# Altium integrated library Samtec_2_mm_Pitch_Socket_Strips.IntLib: 251 symbols (part 2 of 3) (continued)
## SMM-105-01-L-D (continued)
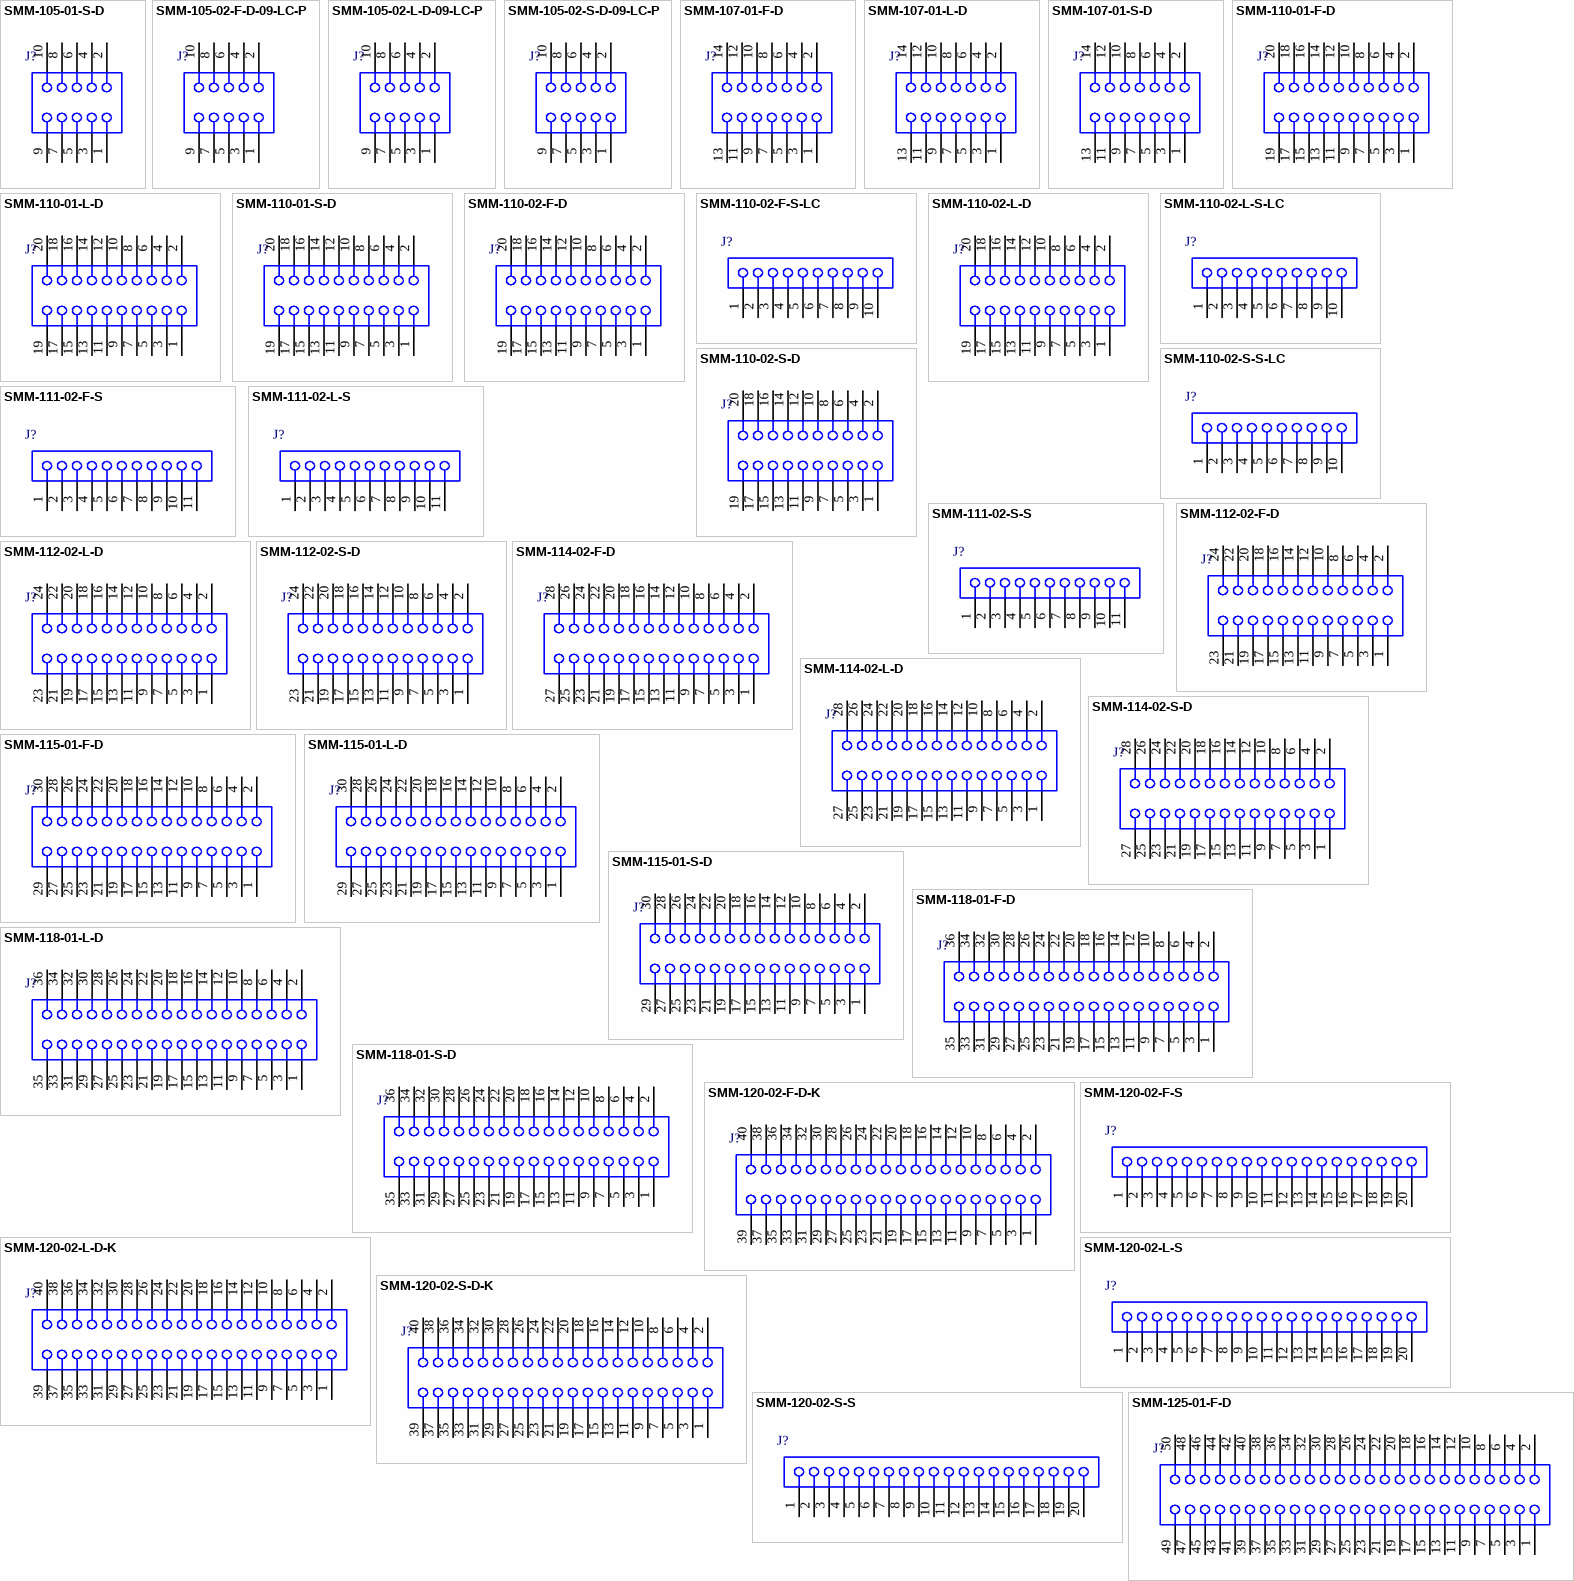
[diagram p4: symbols SMM-105-01-S-D to SMM-125-01-F-D]

## SMM-105-01-S-D
designator J?
Tiger Eye(TM) Socket Strip, Through-hole, Vertical, -55 to 125 degC, 2 mm Pitch, 10-Pin, Female, RoHS; Manufacturer: Samtec; PartNumber: SMM-105-01-S-D; Pitch: 2 mm; DatasheetVersion: F-214; PackageVersion: AU, 5/1991; PackageReference: SMM-105-01-X-D; PackageDescription: 2 mm Socket Strip; Supplier 1: Newark; Supplier Part Number 1: 97P8380; Orientation: Vertical; RoHS: True; Temperature Range: -55 to 125 degC; Mounting Technology: Through-hole; ComponentLink1Description: Manufacturer URL; ComponentLink1URL: http://www.samtec.com; ComponentLink2Description: Datasheet; ComponentLink2URL: http://www.samtec.com/documents/webfiles/pdf/SMM.PDF; ComponentLink3Description: Package Specification; ComponentLink3URL: http://www.samtec.com/documents/webfiles/cpdf/SMM-1XX-XX-XX-D-XX-XX-X-XX-MKT1.pdf
footprint SMTC-SMM-105-01-X-D (Socket Strip, 2x5 Pins, Vertical, 2mm Pitch, Female)
pins: 1, 2, 3, 4, 5, 6, 7, 8, 9, 10

## SMM-105-02-F-D-09-LC-P
designator J?
Tiger Eye(TM) Socket Strip, Surface Mount, Vertical, -55 to 125 degC, 2 mm Pitch, 10-Pin, Female, RoHS; Manufacturer: Samtec; PartNumber: SMM-105-02-F-D-09-LC-P; Pitch: 2 mm; DatasheetVersion: F-214; PackageVersion: AU, 5/1991; PackageReference: SMM-105-02-X-D-09-LC-P; PackageDescription: 2 mm Socket Strip; Orientation: Vertical; RoHS: True; Temperature Range: -55 to 125 degC; Mounting Technology: Surface Mount; ComponentLink1Description: Manufacturer URL; ComponentLink1URL: http://www.samtec.com; ComponentLink2Description: Datasheet; ComponentLink2URL: http://www.samtec.com/documents/webfiles/pdf/SMM.PDF; ComponentLink3Description: Package Specification; ComponentLink3URL: http://www.samtec.com/documents/webfiles/cpdf/SMM-1XX-XX-XX-D-XX-XX-X-XX-MKT1.pdf
footprint SMTC-SMM-105-02-X-D-09-LC-P (Socket Strip, 2x5 Pins, Vertical, 2mm Pitch, Female)
pins: 1, 2, 3, 4, 5, 6, 7, 8, 9, 10

## SMM-105-02-L-D-09-LC-P
designator J?
Tiger Eye(TM) Socket Strip, Surface Mount, Vertical, -55 to 125 degC, 2 mm Pitch, 10-Pin, Female, RoHS; Manufacturer: Samtec; PartNumber: SMM-105-02-L-D-09-LC-P; Pitch: 2 mm; DatasheetVersion: F-214; PackageVersion: AU, 5/1991; PackageReference: SMM-105-02-X-D-09-LC-P; PackageDescription: 2 mm Socket Strip; Orientation: Vertical; RoHS: True; Temperature Range: -55 to 125 degC; Mounting Technology: Surface Mount; ComponentLink1Description: Manufacturer URL; ComponentLink1URL: http://www.samtec.com; ComponentLink2Description: Datasheet; ComponentLink2URL: http://www.samtec.com/documents/webfiles/pdf/SMM.PDF; ComponentLink3Description: Package Specification; ComponentLink3URL: http://www.samtec.com/documents/webfiles/cpdf/SMM-1XX-XX-XX-D-XX-XX-X-XX-MKT1.pdf
footprint SMTC-SMM-105-02-X-D-09-LC-P (Socket Strip, 2x5 Pins, Vertical, 2mm Pitch, Female)
pins: 1, 2, 3, 4, 5, 6, 7, 8, 9, 10

## SMM-105-02-S-D-09-LC-P
designator J?
Tiger Eye(TM) Socket Strip, Surface Mount, Vertical, -55 to 125 degC, 2 mm Pitch, 10-Pin, Female, RoHS; Manufacturer: Samtec; PartNumber: SMM-105-02-S-D-09-LC-P; Pitch: 2 mm; DatasheetVersion: F-214; PackageVersion: AU, 5/1991; PackageReference: SMM-105-02-X-D-09-LC-P; PackageDescription: 2 mm Socket Strip; Orientation: Vertical; RoHS: True; Temperature Range: -55 to 125 degC; Mounting Technology: Surface Mount; ComponentLink1Description: Manufacturer URL; ComponentLink1URL: http://www.samtec.com; ComponentLink2Description: Datasheet; ComponentLink2URL: http://www.samtec.com/documents/webfiles/pdf/SMM.PDF; ComponentLink3Description: Package Specification; ComponentLink3URL: http://www.samtec.com/documents/webfiles/cpdf/SMM-1XX-XX-XX-D-XX-XX-X-XX-MKT1.pdf
footprint SMTC-SMM-105-02-X-D-09-LC-P (Socket Strip, 2x5 Pins, Vertical, 2mm Pitch, Female)
pins: 1, 2, 3, 4, 5, 6, 7, 8, 9, 10

## SMM-107-01-F-D
designator J?
Tiger Eye(TM) Socket Strip, Through-hole, Vertical, -55 to 125 degC, 2 mm Pitch, 14-Pin, Female, RoHS; Manufacturer: Samtec; PartNumber: SMM-107-01-F-D; Pitch: 2 mm; DatasheetVersion: F-214; PackageVersion: AU, 5/1991; PackageReference: SMM-107-01-X-D; PackageDescription: 2 mm Socket Strip; Orientation: Vertical; RoHS: True; Temperature Range: -55 to 125 degC; Mounting Technology: Through-hole; ComponentLink1Description: Manufacturer URL; ComponentLink1URL: http://www.samtec.com; ComponentLink2Description: Datasheet; ComponentLink2URL: http://www.samtec.com/documents/webfiles/pdf/SMM.PDF; ComponentLink3Description: Package Specification; ComponentLink3URL: http://www.samtec.com/documents/webfiles/cpdf/SMM-1XX-XX-XX-D-XX-XX-X-XX-MKT1.pdf
footprint SMTC-SMM-107-01-X-D (Socket Strip, 2x7 Pins, Vertical, 2mm Pitch, Female)
pins: 1, 2, 3, 4, 5, 6, 7, 8, 9, 10, 11, 12, 13, 14

## SMM-107-01-L-D
designator J?
Tiger Eye(TM) Socket Strip, Through-hole, Vertical, -55 to 125 degC, 2 mm Pitch, 14-Pin, Female, RoHS; Manufacturer: Samtec; PartNumber: SMM-107-01-L-D; Pitch: 2 mm; DatasheetVersion: F-214; PackageVersion: AU, 5/1991; PackageReference: SMM-107-01-X-D; PackageDescription: 2 mm Socket Strip; Orientation: Vertical; RoHS: True; Temperature Range: -55 to 125 degC; Mounting Technology: Through-hole; ComponentLink1Description: Manufacturer URL; ComponentLink1URL: http://www.samtec.com; ComponentLink2Description: Datasheet; ComponentLink2URL: http://www.samtec.com/documents/webfiles/pdf/SMM.PDF; ComponentLink3Description: Package Specification; ComponentLink3URL: http://www.samtec.com/documents/webfiles/cpdf/SMM-1XX-XX-XX-D-XX-XX-X-XX-MKT1.pdf
footprint SMTC-SMM-107-01-X-D (Socket Strip, 2x7 Pins, Vertical, 2mm Pitch, Female)
pins: 1, 2, 3, 4, 5, 6, 7, 8, 9, 10, 11, 12, 13, 14

## SMM-107-01-S-D
designator J?
Tiger Eye(TM) Socket Strip, Through-hole, Vertical, -55 to 125 degC, 2 mm Pitch, 14-Pin, Female, RoHS; Manufacturer: Samtec; PartNumber: SMM-107-01-S-D; Pitch: 2 mm; DatasheetVersion: F-214; PackageVersion: AU, 5/1991; PackageReference: SMM-107-01-X-D; PackageDescription: 2 mm Socket Strip; Orientation: Vertical; RoHS: True; Temperature Range: -55 to 125 degC; Mounting Technology: Through-hole; ComponentLink1Description: Manufacturer URL; ComponentLink1URL: http://www.samtec.com; ComponentLink2Description: Datasheet; ComponentLink2URL: http://www.samtec.com/documents/webfiles/pdf/SMM.PDF; ComponentLink3Description: Package Specification; ComponentLink3URL: http://www.samtec.com/documents/webfiles/cpdf/SMM-1XX-XX-XX-D-XX-XX-X-XX-MKT1.pdf
footprint SMTC-SMM-107-01-X-D (Socket Strip, 2x7 Pins, Vertical, 2mm Pitch, Female)
pins: 1, 2, 3, 4, 5, 6, 7, 8, 9, 10, 11, 12, 13, 14

## SMM-110-01-F-D
designator J?
Tiger Eye(TM) Socket Strip, Through-hole, Vertical, -55 to 125 degC, 2 mm Pitch, 20-Pin, Female, RoHS; Manufacturer: Samtec; PartNumber: SMM-110-01-F-D; Pitch: 2 mm; DatasheetVersion: F-214; PackageVersion: AU, 5/1991; PackageReference: SMM-110-01-X-D; PackageDescription: 2 mm Socket Strip; Orientation: Vertical; RoHS: True; Temperature Range: -55 to 125 degC; Mounting Technology: Through-hole; ComponentLink1Description: Manufacturer URL; ComponentLink1URL: http://www.samtec.com; ComponentLink2Description: Datasheet; ComponentLink2URL: http://www.samtec.com/documents/webfiles/pdf/SMM.PDF; ComponentLink3Description: Package Specification; ComponentLink3URL: http://www.samtec.com/documents/webfiles/cpdf/SMM-1XX-XX-XX-D-XX-XX-X-XX-MKT1.pdf
footprint SMTC-SMM-110-01-X-D (Socket Strip, 2x10 Pins, Vertical, 2mm Pitch, Female)
pins: 1, 2, 3, 4, 5, 6, 7, 8, 9, 10, 11, 12, 13, 14, 15, 16, 17, 18, 19, 20

## SMM-110-01-L-D
designator J?
Tiger Eye(TM) Socket Strip, Through-hole, Vertical, -55 to 125 degC, 2 mm Pitch, 20-Pin, Female, RoHS; Manufacturer: Samtec; PartNumber: SMM-110-01-L-D; Pitch: 2 mm; DatasheetVersion: F-214; PackageVersion: AU, 5/1991; PackageReference: SMM-110-01-X-D; PackageDescription: 2 mm Socket Strip; Orientation: Vertical; RoHS: True; Temperature Range: -55 to 125 degC; Mounting Technology: Through-hole; ComponentLink1Description: Manufacturer URL; ComponentLink1URL: http://www.samtec.com; ComponentLink2Description: Datasheet; ComponentLink2URL: http://www.samtec.com/documents/webfiles/pdf/SMM.PDF; ComponentLink3Description: Package Specification; ComponentLink3URL: http://www.samtec.com/documents/webfiles/cpdf/SMM-1XX-XX-XX-D-XX-XX-X-XX-MKT1.pdf
footprint SMTC-SMM-110-01-X-D (Socket Strip, 2x10 Pins, Vertical, 2mm Pitch, Female)
pins: 1, 2, 3, 4, 5, 6, 7, 8, 9, 10, 11, 12, 13, 14, 15, 16, 17, 18, 19, 20

## SMM-110-01-S-D
designator J?
Tiger Eye(TM) Socket Strip, Through-hole, Vertical, -55 to 125 degC, 2 mm Pitch, 20-Pin, Female, RoHS; Manufacturer: Samtec; PartNumber: SMM-110-01-S-D; Pitch: 2 mm; DatasheetVersion: F-214; PackageVersion: AU, 5/1991; PackageReference: SMM-110-01-X-D; PackageDescription: 2 mm Socket Strip; Orientation: Vertical; RoHS: True; Temperature Range: -55 to 125 degC; Mounting Technology: Through-hole; ComponentLink1Description: Manufacturer URL; ComponentLink1URL: http://www.samtec.com; ComponentLink2Description: Datasheet; ComponentLink2URL: http://www.samtec.com/documents/webfiles/pdf/SMM.PDF; ComponentLink3Description: Package Specification; ComponentLink3URL: http://www.samtec.com/documents/webfiles/cpdf/SMM-1XX-XX-XX-D-XX-XX-X-XX-MKT1.pdf
footprint SMTC-SMM-110-01-X-D (Socket Strip, 2x10 Pins, Vertical, 2mm Pitch, Female)
pins: 1, 2, 3, 4, 5, 6, 7, 8, 9, 10, 11, 12, 13, 14, 15, 16, 17, 18, 19, 20

## SMM-110-02-F-D
designator J?
Tiger Eye(TM) Socket Strip, Surface Mount, Vertical, -55 to 125 degC, 2 mm Pitch, 20-Pin, Female, RoHS; Manufacturer: Samtec; PartNumber: SMM-110-02-F-D; Pitch: 2 mm; DatasheetVersion: F-214; PackageVersion: AU, 5/1991; PackageReference: SMM-110-02-X-D; PackageDescription: 2 mm Socket Strip; Orientation: Vertical; RoHS: True; Temperature Range: -55 to 125 degC; Mounting Technology: Surface Mount; ComponentLink1Description: Manufacturer URL; ComponentLink1URL: http://www.samtec.com; ComponentLink2Description: Datasheet; ComponentLink2URL: http://www.samtec.com/documents/webfiles/pdf/SMM.PDF; ComponentLink3Description: Package Specification; ComponentLink3URL: http://www.samtec.com/documents/webfiles/cpdf/SMM-1XX-XX-XX-D-XX-XX-X-XX-MKT1.pdf
footprint SMTC-SMM-110-02-X-D (Socket Strip, 2x10 Pins, Vertical, 2mm Pitch, Female)
pins: 1, 2, 3, 4, 5, 6, 7, 8, 9, 10, 11, 12, 13, 14, 15, 16, 17, 18, 19, 20

## SMM-110-02-F-S-LC
designator J?
Tiger Eye(TM) Socket Strip, Surface Mount, Vertical, -55 to 125 degC, 2 mm Pitch, 10-Pin, Female, RoHS; Manufacturer: Samtec; PartNumber: SMM-110-02-F-S-LC; Pitch: 2 mm; DatasheetVersion: F-214; PackageVersion: BC, 5/1991; PackageReference: SMM-110-02-X-S-LC; PackageDescription: 2 mm Socket Strip (Single Row); Orientation: Vertical; RoHS: True; Temperature Range: -55 to 125 degC; Mounting Technology: Surface Mount; ComponentLink1Description: Manufacturer URL; ComponentLink1URL: http://www.samtec.com; ComponentLink2Description: Datasheet; ComponentLink2URL: http://www.samtec.com/documents/webfiles/pdf/SMM.PDF; ComponentLink3Description: Package Specification; ComponentLink3URL: http://www.samtec.com/documents/webfiles/cpdf/SMM-1XX-XX-XX-S-XX-X-XX-XX-MKT.pdf
footprint SMTC-SMM-110-02-X-S-LC (Socket Strip, 10 Pins, Vertical, 2mm Pitch, Female)
pins: 1, 2, 3, 4, 5, 6, 7, 8, 9, 10

## SMM-110-02-L-D
designator J?
Tiger Eye(TM) Socket Strip, Surface Mount, Vertical, -55 to 125 degC, 2 mm Pitch, 20-Pin, Female, RoHS; Manufacturer: Samtec; PartNumber: SMM-110-02-L-D; Pitch: 2 mm; DatasheetVersion: F-214; PackageVersion: AU, 5/1991; PackageReference: SMM-110-02-X-D; PackageDescription: 2 mm Socket Strip; Orientation: Vertical; RoHS: True; Temperature Range: -55 to 125 degC; Mounting Technology: Surface Mount; ComponentLink1Description: Manufacturer URL; ComponentLink1URL: http://www.samtec.com; ComponentLink2Description: Datasheet; ComponentLink2URL: http://www.samtec.com/documents/webfiles/pdf/SMM.PDF; ComponentLink3Description: Package Specification; ComponentLink3URL: http://www.samtec.com/documents/webfiles/cpdf/SMM-1XX-XX-XX-D-XX-XX-X-XX-MKT1.pdf
footprint SMTC-SMM-110-02-X-D (Socket Strip, 2x10 Pins, Vertical, 2mm Pitch, Female)
pins: 1, 2, 3, 4, 5, 6, 7, 8, 9, 10, 11, 12, 13, 14, 15, 16, 17, 18, 19, 20

## SMM-110-02-L-S-LC
designator J?
Tiger Eye(TM) Socket Strip, Surface Mount, Vertical, -55 to 125 degC, 2 mm Pitch, 10-Pin, Female, RoHS; Manufacturer: Samtec; PartNumber: SMM-110-02-L-S-LC; Pitch: 2 mm; DatasheetVersion: F-214; PackageVersion: BC, 5/1991; PackageReference: SMM-110-02-X-S-LC; PackageDescription: 2 mm Socket Strip (Single Row); Orientation: Vertical; RoHS: True; Temperature Range: -55 to 125 degC; Mounting Technology: Surface Mount; ComponentLink1Description: Manufacturer URL; ComponentLink1URL: http://www.samtec.com; ComponentLink2Description: Datasheet; ComponentLink2URL: http://www.samtec.com/documents/webfiles/pdf/SMM.PDF; ComponentLink3Description: Package Specification; ComponentLink3URL: http://www.samtec.com/documents/webfiles/cpdf/SMM-1XX-XX-XX-S-XX-X-XX-XX-MKT.pdf
footprint SMTC-SMM-110-02-X-S-LC (Socket Strip, 10 Pins, Vertical, 2mm Pitch, Female)
pins: 1, 2, 3, 4, 5, 6, 7, 8, 9, 10

## SMM-110-02-S-D
designator J?
Tiger Eye(TM) Socket Strip, Surface Mount, Vertical, -55 to 125 degC, 2 mm Pitch, 20-Pin, Female, RoHS; Manufacturer: Samtec; PartNumber: SMM-110-02-S-D; Pitch: 2 mm; DatasheetVersion: F-214; PackageVersion: AU, 5/1991; PackageReference: SMM-110-02-X-D; PackageDescription: 2 mm Socket Strip; Supplier 1: Digi-Key; Supplier Part Number 1: SAM1243-10-ND; Supplier 2: Farnell; Supplier Part Number 2: 1668126; Orientation: Vertical; RoHS: True; Temperature Range: -55 to 125 degC; Mounting Technology: Surface Mount; ComponentLink1Description: Manufacturer URL; ComponentLink1URL: http://www.samtec.com; ComponentLink2Description: Datasheet; ComponentLink2URL: http://www.samtec.com/documents/webfiles/pdf/SMM.PDF; ComponentLink3Description: Package Specification; ComponentLink3URL: http://www.samtec.com/documents/webfiles/cpdf/SMM-1XX-XX-XX-D-XX-XX-X-XX-MKT1.pdf
footprint SMTC-SMM-110-02-X-D (Socket Strip, 2x10 Pins, Vertical, 2mm Pitch, Female)
pins: 1, 2, 3, 4, 5, 6, 7, 8, 9, 10, 11, 12, 13, 14, 15, 16, 17, 18, 19, 20

## SMM-110-02-S-S-LC
designator J?
Tiger Eye(TM) Socket Strip, Surface Mount, Vertical, -55 to 125 degC, 2 mm Pitch, 10-Pin, Female, RoHS; Manufacturer: Samtec; PartNumber: SMM-110-02-S-S-LC; Pitch: 2 mm; DatasheetVersion: F-214; PackageVersion: BC, 5/1991; PackageReference: SMM-110-02-X-S-LC; PackageDescription: 2 mm Socket Strip (Single Row); Orientation: Vertical; RoHS: True; Temperature Range: -55 to 125 degC; Mounting Technology: Surface Mount; ComponentLink1Description: Manufacturer URL; ComponentLink1URL: http://www.samtec.com; ComponentLink2Description: Datasheet; ComponentLink2URL: http://www.samtec.com/documents/webfiles/pdf/SMM.PDF; ComponentLink3Description: Package Specification; ComponentLink3URL: http://www.samtec.com/documents/webfiles/cpdf/SMM-1XX-XX-XX-S-XX-X-XX-XX-MKT.pdf
footprint SMTC-SMM-110-02-X-S-LC (Socket Strip, 10 Pins, Vertical, 2mm Pitch, Female)
pins: 1, 2, 3, 4, 5, 6, 7, 8, 9, 10

## SMM-111-02-F-S
designator J?
Tiger Eye(TM) Socket Strip, Surface Mount, Vertical, -55 to 125 degC, 2 mm Pitch, 11-Pin, Female, RoHS; Manufacturer: Samtec; PartNumber: SMM-111-02-F-S; Pitch: 2 mm; DatasheetVersion: F-214; PackageVersion: BC, 5/1991; PackageReference: SMM-111-02-X-S; PackageDescription: 2 mm Socket Strip (Single Row); Orientation: Vertical; RoHS: True; Temperature Range: -55 to 125 degC; Mounting Technology: Surface Mount; ComponentLink1Description: Manufacturer URL; ComponentLink1URL: http://www.samtec.com; ComponentLink2Description: Datasheet; ComponentLink2URL: http://www.samtec.com/documents/webfiles/pdf/SMM.PDF; ComponentLink3Description: Package Specification; ComponentLink3URL: http://www.samtec.com/documents/webfiles/cpdf/SMM-1XX-XX-XX-S-XX-X-XX-XX-MKT.pdf
footprint SMTC-SMM-111-02-X-S (Socket Strip, 11 Pins, Vertical, 2mm Pitch, Female)
pins: 1, 2, 3, 4, 5, 6, 7, 8, 9, 10, 11

## SMM-111-02-L-S
designator J?
Tiger Eye(TM) Socket Strip, Surface Mount, Vertical, -55 to 125 degC, 2 mm Pitch, 11-Pin, Female, RoHS; Manufacturer: Samtec; PartNumber: SMM-111-02-L-S; Pitch: 2 mm; DatasheetVersion: F-214; PackageVersion: BC, 5/1991; PackageReference: SMM-111-02-X-S; PackageDescription: 2 mm Socket Strip (Single Row); Orientation: Vertical; RoHS: True; Temperature Range: -55 to 125 degC; Mounting Technology: Surface Mount; ComponentLink1Description: Manufacturer URL; ComponentLink1URL: http://www.samtec.com; ComponentLink2Description: Datasheet; ComponentLink2URL: http://www.samtec.com/documents/webfiles/pdf/SMM.PDF; ComponentLink3Description: Package Specification; ComponentLink3URL: http://www.samtec.com/documents/webfiles/cpdf/SMM-1XX-XX-XX-S-XX-X-XX-XX-MKT.pdf
footprint SMTC-SMM-111-02-X-S (Socket Strip, 11 Pins, Vertical, 2mm Pitch, Female)
pins: 1, 2, 3, 4, 5, 6, 7, 8, 9, 10, 11

## SMM-111-02-S-S
designator J?
Tiger Eye(TM) Socket Strip, Surface Mount, Vertical, -55 to 125 degC, 2 mm Pitch, 11-Pin, Female, RoHS; Manufacturer: Samtec; PartNumber: SMM-111-02-S-S; Pitch: 2 mm; DatasheetVersion: F-214; PackageVersion: BC, 5/1991; PackageReference: SMM-111-02-X-S; PackageDescription: 2 mm Socket Strip (Single Row); Supplier 1: Digi-Key; Supplier Part Number 1: SAM1244-11-ND; Orientation: Vertical; RoHS: True; Temperature Range: -55 to 125 degC; Mounting Technology: Surface Mount; ComponentLink1Description: Manufacturer URL; ComponentLink1URL: http://www.samtec.com; ComponentLink2Description: Datasheet; ComponentLink2URL: http://www.samtec.com/documents/webfiles/pdf/SMM.PDF; ComponentLink3Description: Package Specification; ComponentLink3URL: http://www.samtec.com/documents/webfiles/cpdf/SMM-1XX-XX-XX-S-XX-X-XX-XX-MKT.pdf
footprint SMTC-SMM-111-02-X-S (Socket Strip, 11 Pins, Vertical, 2mm Pitch, Female)
pins: 1, 2, 3, 4, 5, 6, 7, 8, 9, 10, 11

## SMM-112-02-F-D
designator J?
Tiger Eye(TM) Socket Strip, Surface Mount, Vertical, -55 to 125 degC, 2 mm Pitch, 24-Pin, Female, RoHS; Manufacturer: Samtec; PartNumber: SMM-112-02-F-D; Pitch: 2 mm; DatasheetVersion: F-214; PackageVersion: AU, 5/1991; PackageReference: SMM-112-02-X-D; PackageDescription: 2 mm Socket Strip; Orientation: Vertical; RoHS: True; Temperature Range: -55 to 125 degC; Mounting Technology: Surface Mount; ComponentLink1Description: Manufacturer URL; ComponentLink1URL: http://www.samtec.com; ComponentLink2Description: Datasheet; ComponentLink2URL: http://www.samtec.com/documents/webfiles/pdf/SMM.PDF; ComponentLink3Description: Package Specification; ComponentLink3URL: http://www.samtec.com/documents/webfiles/cpdf/SMM-1XX-XX-XX-D-XX-XX-X-XX-MKT1.pdf
footprint SMTC-SMM-112-02-X-D (Socket Strip, 2x12 Pins, Vertical, 2mm Pitch, Female)
pins: 1, 2, 3, 4, 5, 6, 7, 8, 9, 10, 11, 12, 13, 14, 15, 16, 17, 18, 19, 20, 21, 22, 23, 24

## SMM-112-02-L-D
designator J?
Tiger Eye(TM) Socket Strip, Surface Mount, Vertical, -55 to 125 degC, 2 mm Pitch, 24-Pin, Female, RoHS; Manufacturer: Samtec; PartNumber: SMM-112-02-L-D; Pitch: 2 mm; DatasheetVersion: F-214; PackageVersion: AU, 5/1991; PackageReference: SMM-112-02-X-D; PackageDescription: 2 mm Socket Strip; Orientation: Vertical; RoHS: True; Temperature Range: -55 to 125 degC; Mounting Technology: Surface Mount; ComponentLink1Description: Manufacturer URL; ComponentLink1URL: http://www.samtec.com; ComponentLink2Description: Datasheet; ComponentLink2URL: http://www.samtec.com/documents/webfiles/pdf/SMM.PDF; ComponentLink3Description: Package Specification; ComponentLink3URL: http://www.samtec.com/documents/webfiles/cpdf/SMM-1XX-XX-XX-D-XX-XX-X-XX-MKT1.pdf
footprint SMTC-SMM-112-02-X-D (Socket Strip, 2x12 Pins, Vertical, 2mm Pitch, Female)
pins: 1, 2, 3, 4, 5, 6, 7, 8, 9, 10, 11, 12, 13, 14, 15, 16, 17, 18, 19, 20, 21, 22, 23, 24

## SMM-112-02-S-D
designator J?
Tiger Eye(TM) Socket Strip, Surface Mount, Vertical, -55 to 125 degC, 2 mm Pitch, 24-Pin, Female, RoHS; Manufacturer: Samtec; PartNumber: SMM-112-02-S-D; Pitch: 2 mm; DatasheetVersion: F-214; PackageVersion: AU, 5/1991; PackageReference: SMM-112-02-X-D; PackageDescription: 2 mm Socket Strip; Supplier 1: Digi-Key; Supplier Part Number 1: SAM1243-12-ND; Orientation: Vertical; RoHS: True; Temperature Range: -55 to 125 degC; Mounting Technology: Surface Mount; ComponentLink1Description: Manufacturer URL; ComponentLink1URL: http://www.samtec.com; ComponentLink2Description: Datasheet; ComponentLink2URL: http://www.samtec.com/documents/webfiles/pdf/SMM.PDF; ComponentLink3Description: Package Specification; ComponentLink3URL: http://www.samtec.com/documents/webfiles/cpdf/SMM-1XX-XX-XX-D-XX-XX-X-XX-MKT1.pdf
footprint SMTC-SMM-112-02-X-D (Socket Strip, 2x12 Pins, Vertical, 2mm Pitch, Female)
pins: 1, 2, 3, 4, 5, 6, 7, 8, 9, 10, 11, 12, 13, 14, 15, 16, 17, 18, 19, 20, 21, 22, 23, 24

## SMM-114-02-F-D
designator J?
Tiger Eye(TM) Socket Strip, Surface Mount, Vertical, -55 to 125 degC, 2 mm Pitch, 28-Pin, Female, RoHS; Manufacturer: Samtec; PartNumber: SMM-114-02-F-D; Pitch: 2 mm; DatasheetVersion: F-214; PackageVersion: AU, 5/1991; PackageReference: SMM-114-02-X-D; PackageDescription: 2 mm Socket Strip; Orientation: Vertical; RoHS: True; Temperature Range: -55 to 125 degC; Mounting Technology: Surface Mount; ComponentLink1Description: Manufacturer URL; ComponentLink1URL: http://www.samtec.com; ComponentLink2Description: Datasheet; ComponentLink2URL: http://www.samtec.com/documents/webfiles/pdf/SMM.PDF; ComponentLink3Description: Package Specification; ComponentLink3URL: http://www.samtec.com/documents/webfiles/cpdf/SMM-1XX-XX-XX-D-XX-XX-X-XX-MKT1.pdf
footprint SMTC-SMM-114-02-X-D (Socket Strip, 2x12 Pins, Vertical, 2mm Pitch, Female)
pins: 1, 2, 3, 4, 5, 6, 7, 8, 9, 10, 11, 12, 13, 14, 15, 16, 17, 18, 19, 20, 21, 22, 23, 24, 25, 26, 27, 28

## SMM-114-02-L-D
designator J?
Tiger Eye(TM) Socket Strip, Surface Mount, Vertical, -55 to 125 degC, 2 mm Pitch, 28-Pin, Female, RoHS; Manufacturer: Samtec; PartNumber: SMM-114-02-L-D; Pitch: 2 mm; DatasheetVersion: F-214; PackageVersion: AU, 5/1991; PackageReference: SMM-114-02-X-D; PackageDescription: 2 mm Socket Strip; Orientation: Vertical; RoHS: True; Temperature Range: -55 to 125 degC; Mounting Technology: Surface Mount; ComponentLink1Description: Manufacturer URL; ComponentLink1URL: http://www.samtec.com; ComponentLink2Description: Datasheet; ComponentLink2URL: http://www.samtec.com/documents/webfiles/pdf/SMM.PDF; ComponentLink3Description: Package Specification; ComponentLink3URL: http://www.samtec.com/documents/webfiles/cpdf/SMM-1XX-XX-XX-D-XX-XX-X-XX-MKT1.pdf
footprint SMTC-SMM-114-02-X-D (Socket Strip, 2x12 Pins, Vertical, 2mm Pitch, Female)
pins: 1, 2, 3, 4, 5, 6, 7, 8, 9, 10, 11, 12, 13, 14, 15, 16, 17, 18, 19, 20, 21, 22, 23, 24, 25, 26, 27, 28

## SMM-114-02-S-D
designator J?
Tiger Eye(TM) Socket Strip, Surface Mount, Vertical, -55 to 125 degC, 2 mm Pitch, 28-Pin, Female, RoHS; Manufacturer: Samtec; PartNumber: SMM-114-02-S-D; Pitch: 2 mm; DatasheetVersion: F-214; PackageVersion: AU, 5/1991; PackageReference: SMM-114-02-X-D; PackageDescription: 2 mm Socket Strip; Supplier 1: Digi-Key; Supplier Part Number 1: SAM1243-14-ND; Orientation: Vertical; RoHS: True; Temperature Range: -55 to 125 degC; Mounting Technology: Surface Mount; ComponentLink1Description: Manufacturer URL; ComponentLink1URL: http://www.samtec.com; ComponentLink2Description: Datasheet; ComponentLink2URL: http://www.samtec.com/documents/webfiles/pdf/SMM.PDF; ComponentLink3Description: Package Specification; ComponentLink3URL: http://www.samtec.com/documents/webfiles/cpdf/SMM-1XX-XX-XX-D-XX-XX-X-XX-MKT1.pdf
footprint SMTC-SMM-114-02-X-D (Socket Strip, 2x12 Pins, Vertical, 2mm Pitch, Female)
pins: 1, 2, 3, 4, 5, 6, 7, 8, 9, 10, 11, 12, 13, 14, 15, 16, 17, 18, 19, 20, 21, 22, 23, 24, 25, 26, 27, 28

## SMM-115-01-F-D
designator J?
Tiger Eye(TM) Socket Strip, Through-hole, Vertical, -55 to 125 degC, 2 mm Pitch, 30-Pin, Female, RoHS; Manufacturer: Samtec; PartNumber: SMM-115-01-F-D; Pitch: 2 mm; DatasheetVersion: F-214; PackageVersion: AU, 5/1991; PackageReference: SMM-115-01-X-D; PackageDescription: 2 mm Socket Strip; Orientation: Vertical; RoHS: True; Temperature Range: -55 to 125 degC; Mounting Technology: Through-hole; ComponentLink1Description: Manufacturer URL; ComponentLink1URL: http://www.samtec.com; ComponentLink2Description: Datasheet; ComponentLink2URL: http://www.samtec.com/documents/webfiles/pdf/SMM.PDF; ComponentLink3Description: Package Specification; ComponentLink3URL: http://www.samtec.com/documents/webfiles/cpdf/SMM-1XX-XX-XX-D-XX-XX-X-XX-MKT1.pdf
footprint SMTC-SMM-115-01-X-D (Socket Strip, 2x15 Pins, Vertical, 2mm Pitch, Female)
pins: 1, 2, 3, 4, 5, 6, 7, 8, 9, 10, 11, 12, 13, 14, 15, 16, 17, 18, 19, 20, 21, 22, 23, 24, 25, 26, 27, 28, 29, 30

## SMM-115-01-L-D
designator J?
Tiger Eye(TM) Socket Strip, Through-hole, Vertical, -55 to 125 degC, 2 mm Pitch, 30-Pin, Female, RoHS; Manufacturer: Samtec; PartNumber: SMM-115-01-L-D; Pitch: 2 mm; DatasheetVersion: F-214; PackageVersion: AU, 5/1991; PackageReference: SMM-115-01-X-D; PackageDescription: 2 mm Socket Strip; Orientation: Vertical; RoHS: True; Temperature Range: -55 to 125 degC; Mounting Technology: Through-hole; ComponentLink1Description: Manufacturer URL; ComponentLink1URL: http://www.samtec.com; ComponentLink2Description: Datasheet; ComponentLink2URL: http://www.samtec.com/documents/webfiles/pdf/SMM.PDF; ComponentLink3Description: Package Specification; ComponentLink3URL: http://www.samtec.com/documents/webfiles/cpdf/SMM-1XX-XX-XX-D-XX-XX-X-XX-MKT1.pdf
footprint SMTC-SMM-115-01-X-D (Socket Strip, 2x15 Pins, Vertical, 2mm Pitch, Female)
pins: 1, 2, 3, 4, 5, 6, 7, 8, 9, 10, 11, 12, 13, 14, 15, 16, 17, 18, 19, 20, 21, 22, 23, 24, 25, 26, 27, 28, 29, 30

## SMM-115-01-S-D
designator J?
Tiger Eye(TM) Socket Strip, Through-hole, Vertical, -55 to 125 degC, 2 mm Pitch, 30-Pin, Female, RoHS; Manufacturer: Samtec; PartNumber: SMM-115-01-S-D; Pitch: 2 mm; DatasheetVersion: F-214; PackageVersion: AU, 5/1991; PackageReference: SMM-115-01-X-D; PackageDescription: 2 mm Socket Strip; Orientation: Vertical; RoHS: True; Temperature Range: -55 to 125 degC; Mounting Technology: Through-hole; ComponentLink1Description: Manufacturer URL; ComponentLink1URL: http://www.samtec.com; ComponentLink2Description: Datasheet; ComponentLink2URL: http://www.samtec.com/documents/webfiles/pdf/SMM.PDF; ComponentLink3Description: Package Specification; ComponentLink3URL: http://www.samtec.com/documents/webfiles/cpdf/SMM-1XX-XX-XX-D-XX-XX-X-XX-MKT1.pdf
footprint SMTC-SMM-115-01-X-D (Socket Strip, 2x15 Pins, Vertical, 2mm Pitch, Female)
pins: 1, 2, 3, 4, 5, 6, 7, 8, 9, 10, 11, 12, 13, 14, 15, 16, 17, 18, 19, 20, 21, 22, 23, 24, 25, 26, 27, 28, 29, 30

## SMM-118-01-F-D
designator J?
Tiger Eye(TM) Socket Strip, Through-hole, Vertical, -55 to 125 degC, 2 mm Pitch, 36-Pin, Female, RoHS; Manufacturer: Samtec; PartNumber: SMM-118-01-F-D; Pitch: 2 mm; DatasheetVersion: F-214; PackageVersion: AU, 5/1991; PackageReference: SMM-118-01-X-D; PackageDescription: 2 mm Socket Strip; Orientation: Vertical; RoHS: True; Temperature Range: -55 to 125 degC; Mounting Technology: Through-hole; ComponentLink1Description: Manufacturer URL; ComponentLink1URL: http://www.samtec.com; ComponentLink2Description: Datasheet; ComponentLink2URL: http://www.samtec.com/documents/webfiles/pdf/SMM.PDF; ComponentLink3Description: Package Specification; ComponentLink3URL: http://www.samtec.com/documents/webfiles/cpdf/SMM-1XX-XX-XX-D-XX-XX-X-XX-MKT1.pdf
footprint SMTC-SMM-118-01-X-D (Socket Strip, 2x18 Pins, Vertical, 2mm Pitch, Female)
pins: 1, 2, 3, 4, 5, 6, 7, 8, 9, 10, 11, 12, 13, 14, 15, 16, 17, 18, 19, 20, 21, 22, 23, 24, 25, 26, 27, 28, 29, 30, 31, 32, 33, 34, 35, 36

## SMM-118-01-L-D
designator J?
Tiger Eye(TM) Socket Strip, Through-hole, Vertical, -55 to 125 degC, 2 mm Pitch, 36-Pin, Female, RoHS; Manufacturer: Samtec; PartNumber: SMM-118-01-L-D; Pitch: 2 mm; DatasheetVersion: F-214; PackageVersion: AU, 5/1991; PackageReference: SMM-118-01-X-D; PackageDescription: 2 mm Socket Strip; Orientation: Vertical; RoHS: True; Temperature Range: -55 to 125 degC; Mounting Technology: Through-hole; ComponentLink1Description: Manufacturer URL; ComponentLink1URL: http://www.samtec.com; ComponentLink2Description: Datasheet; ComponentLink2URL: http://www.samtec.com/documents/webfiles/pdf/SMM.PDF; ComponentLink3Description: Package Specification; ComponentLink3URL: http://www.samtec.com/documents/webfiles/cpdf/SMM-1XX-XX-XX-D-XX-XX-X-XX-MKT1.pdf
footprint SMTC-SMM-118-01-X-D (Socket Strip, 2x18 Pins, Vertical, 2mm Pitch, Female)
pins: 1, 2, 3, 4, 5, 6, 7, 8, 9, 10, 11, 12, 13, 14, 15, 16, 17, 18, 19, 20, 21, 22, 23, 24, 25, 26, 27, 28, 29, 30, 31, 32, 33, 34, 35, 36

## SMM-118-01-S-D
designator J?
Tiger Eye(TM) Socket Strip, Through-hole, Vertical, -55 to 125 degC, 2 mm Pitch, 36-Pin, Female, RoHS; Manufacturer: Samtec; PartNumber: SMM-118-01-S-D; Pitch: 2 mm; DatasheetVersion: F-214; PackageVersion: AU, 5/1991; PackageReference: SMM-118-01-X-D; PackageDescription: 2 mm Socket Strip; Orientation: Vertical; RoHS: True; Temperature Range: -55 to 125 degC; Mounting Technology: Through-hole; ComponentLink1Description: Manufacturer URL; ComponentLink1URL: http://www.samtec.com; ComponentLink2Description: Datasheet; ComponentLink2URL: http://www.samtec.com/documents/webfiles/pdf/SMM.PDF; ComponentLink3Description: Package Specification; ComponentLink3URL: http://www.samtec.com/documents/webfiles/cpdf/SMM-1XX-XX-XX-D-XX-XX-X-XX-MKT1.pdf
footprint SMTC-SMM-118-01-X-D (Socket Strip, 2x18 Pins, Vertical, 2mm Pitch, Female)
pins: 1, 2, 3, 4, 5, 6, 7, 8, 9, 10, 11, 12, 13, 14, 15, 16, 17, 18, 19, 20, 21, 22, 23, 24, 25, 26, 27, 28, 29, 30, 31, 32, 33, 34, 35, 36

## SMM-120-02-F-D-K
designator J?
Tiger Eye(TM) Socket Strip, Surface Mount, Vertical, -55 to 125 degC, 2 mm Pitch, 40-Pin, Female, RoHS; Manufacturer: Samtec; PartNumber: SMM-120-02-F-D-K; Pitch: 2 mm; DatasheetVersion: F-214; PackageVersion: AU, 5/1991; PackageReference: SMM-120-02-X-D-K; PackageDescription: 2 mm Socket Strip; Orientation: Vertical; RoHS: True; Temperature Range: -55 to 125 degC; Mounting Technology: Surface Mount; ComponentLink1Description: Manufacturer URL; ComponentLink1URL: http://www.samtec.com; ComponentLink2Description: Datasheet; ComponentLink2URL: http://www.samtec.com/documents/webfiles/pdf/SMM.PDF; ComponentLink3Description: Package Specification; ComponentLink3URL: http://www.samtec.com/documents/webfiles/cpdf/SMM-1XX-XX-XX-D-XX-XX-X-XX-MKT1.pdf
footprint SMTC-SMM-120-02-X-D-K (Socket Strip, 2x20 Pins, Vertical, 2mm Pitch, Female)
pins: 1, 2, 3, 4, 5, 6, 7, 8, 9, 10, 11, 12, 13, 14, 15, 16, 17, 18, 19, 20, 21, 22, 23, 24, 25, 26, 27, 28, 29, 30, 31, 32, 33, 34, 35, 36, 37, 38, 39, 40

## SMM-120-02-F-S
designator J?
Tiger Eye(TM) Socket Strip, Surface Mount, Vertical, -55 to 125 degC, 2 mm Pitch, 20-Pin, Female, RoHS; Manufacturer: Samtec; PartNumber: SMM-120-02-F-S; Pitch: 2 mm; DatasheetVersion: F-214; PackageVersion: BC, 5/1991; PackageReference: SMM-120-02-X-S; PackageDescription: 2 mm Socket Strip (Single Row); Orientation: Vertical; RoHS: True; Temperature Range: -55 to 125 degC; Mounting Technology: Surface Mount; ComponentLink1Description: Manufacturer URL; ComponentLink1URL: http://www.samtec.com; ComponentLink2Description: Datasheet; ComponentLink2URL: http://www.samtec.com/documents/webfiles/pdf/SMM.PDF; ComponentLink3Description: Package Specification; ComponentLink3URL: http://www.samtec.com/documents/webfiles/cpdf/SMM-1XX-XX-XX-S-XX-X-XX-XX-MKT.pdf
footprint SMTC-SMM-120-02-X-S (Socket Strip, 20 Pins, Vertical, 2mm Pitch, Female)
pins: 1, 2, 3, 4, 5, 6, 7, 8, 9, 10, 11, 12, 13, 14, 15, 16, 17, 18, 19, 20
